# Altium footprint library SAMTEC SMD.PcbLib: 165 footprints (part 8 of 17) (continued)
## SAMTEC_MEC6-130-02-L-D-RA1 [mm] "60 Contacts, Pitch 0.635mm, Double Row Right Angle Edge Card Socket"
height 5.78
pads (62):
  rect 0.4x2 smd mask+0: 1(-9.207,-4) 2(-9.207,4) 3(-8.572,-4) 4(-8.572,4) 5(-7.938,-4) 6(-7.938,4) 7(-7.302,-4) 8(-7.302,4) 9(-6.667,-4) 10(-6.667,4) 11(-6.032,-4) 12(-6.032,4) 13(-5.397,-4) 14(-5.397,4) 15(-4.763,-4) 16(-4.763,4) 17(-4.127,-4) 18(-4.127,4) 19(-3.492,-4) 20(-3.492,4) 21(-2.857,-4) 22(-2.857,4) 23(-2.222,-4) 24(-2.222,4) 25(-1.587,-4) 26(-1.587,4) 27(-0.953,-4) 28(-0.953,4) 29(-0.318,-4) 30(-0.318,4) 31(0.318,-4) 32(0.318,4) 33(0.953,-4) 34(0.953,4) 35(1.587,-4) 36(1.587,4) 37(2.222,-4) 38(2.222,4) 39(2.857,-4) 40(2.857,4) 41(3.492,-4) 42(3.492,4) 43(4.127,-4) 44(4.127,4) 45(4.763,-4) 46(4.763,4) 47(5.397,-4) 48(5.397,4) 49(6.032,-4) 50(6.032,4) 51(6.667,-4) 52(6.667,4) 53(7.302,-4) 54(7.302,4) 55(7.938,-4) 56(7.938,4) 57(8.572,-4) 58(8.572,4) 59(9.207,-4) 60(9.207,4)
  round 0.5 hole 1.55 unplated mask+0.525: 61(-10.428,0) 62(10.401,0)
Top Overlay:
  circle w0.25: c-10.1,-4.65 r0.125
  lines w0.2: -11.11,-1.1 -11.11,-3.7 -9.757,-3.7 ; -11.11,1.1 -11.11,2.5 -9.91,3.7 -9.757,3.7 ; -9.407,-2.65 -9.407,-1.4 -9.008,-1.4 -9.008,-2.65 ; -8.772,-2.65 -8.772,-1.4 -8.373,-1.4 -8.373,-2.65 ; -8.137,-2.65 -8.137,-1.4 -7.738,-1.4 -7.738,-2.65 ; -7.502,-2.65 -7.502,-1.4 -7.103,-1.4 -7.103,-2.65 ; -6.867,-2.65 -6.867,-1.4 -6.468,-1.4 -6.468,-2.65 ; -6.232,-2.65 -6.232,-1.4 -5.833,-1.4 -5.833,-2.65 ; -5.597,-2.65 -5.597,-1.4 -5.198,-1.4 -5.198,-2.65 ; -4.962,-2.65 -4.962,-1.4 -4.563,-1.4 -4.563,-2.65 ; -4.327,-2.65 -4.327,-1.4 -3.928,-1.4 -3.928,-2.65 ; -3.692,-2.65 -3.692,-1.4 -3.293,-1.4 -3.293,-2.65 ; -3.057,-2.65 -3.057,-1.4 -2.658,-1.4 -2.658,-2.65 ; -2.422,-2.65 -2.422,-1.4 -2.023,-1.4 -2.023,-2.65 ; -1.787,-2.65 -1.787,-1.4 -1.388,-1.4 -1.388,-2.65 ; -1.152,-2.65 -1.152,-1.4 -0.753,-1.4 -0.753,-2.65 ; -0.517,-2.65 -0.517,-1.4 -0.118,-1.4 -0.118,-2.65 ; 0.118,-2.65 0.118,-1.4 0.517,-1.4 0.517,-2.65 ; 0.753,-2.65 0.753,-1.4 1.152,-1.4 1.152,-2.65 ; 1.388,-2.65 1.388,-1.4 1.787,-1.4 1.787,-2.65 ; 2.023,-2.65 2.023,-1.4 2.422,-1.4 2.422,-2.65 ; 2.658,-2.65 2.658,-1.4 3.057,-1.4 3.057,-2.65 ; 3.293,-2.65 3.293,-1.4 3.692,-1.4 3.692,-2.65 ; 3.928,-2.65 3.928,-1.4 4.327,-1.4 4.327,-2.65 ; 4.563,-2.65 4.563,-1.4 4.962,-1.4 4.962,-2.65 ; 5.198,-2.65 5.198,-1.4 5.597,-1.4 5.597,-2.65 ; 5.833,-2.65 5.833,-1.4 6.232,-1.4 6.232,-2.65 ; 6.468,-2.65 6.468,-1.4 6.867,-1.4 6.867,-2.65 ; 7.103,-2.65 7.103,-1.4 7.502,-1.4 7.502,-2.65 ; 7.738,-2.65 7.738,-1.4 8.137,-1.4 8.137,-2.65 ; 8.373,-2.65 8.373,-1.4 8.772,-1.4 8.772,-2.65 ; 9.008,-2.65 9.008,-1.4 9.407,-1.4 9.407,-2.65 ; 9.757,-3.7 11.11,-3.7 11.11,-1.1 ; 9.757,3.7 9.91,3.7 11.11,2.5 11.11,1.1
Mechanical 8:
  drawing of 377 lines, arcs and shapes, not listed
Mechanical 14:
  drawing of 306 lines, arcs and shapes, not listed
Mechanical 15:
  lines w0.05: -11.36,-5.25 11.36,-5.25 11.36,5.25 -11.36,5.25 -11.36,-5.25
3D body "SAMTEC_MEC6-130-02-L-D-RA1.stp": height 5.78, standoff -1.05, extent -11.11,-4.55 11.11,4.55

## SAMTEC_MEC6-130-02-L-DV-A [mm] "60 Contacts, Pitch 0.635mm, Double Row Vertical Micro Edge Card Socket"
height 8.65
pads (62):
  rect 0.4x1.8 smd mask+0: 1(-9.207,-3.85) 2(-9.207,3.85) 3(-8.572,-3.85) 4(-8.572,3.85) 5(-7.938,-3.85) 6(-7.938,3.85) 7(-7.302,-3.85) 8(-7.302,3.85) 9(-6.667,-3.85) 10(-6.667,3.85) 11(-6.032,-3.85) 12(-6.032,3.85) 13(-5.397,-3.85) 14(-5.397,3.85) 15(-4.763,-3.85) 16(-4.763,3.85) 17(-4.127,-3.85) 18(-4.127,3.85) 19(-3.492,-3.85) 20(-3.492,3.85) 21(-2.857,-3.85) 22(-2.857,3.85) 23(-2.222,-3.85) 24(-2.222,3.85) 25(-1.587,-3.85) 26(-1.587,3.85) 27(-0.953,-3.85) 28(-0.953,3.85) 29(-0.318,-3.85) 30(-0.318,3.85) 31(0.318,-3.85) 32(0.318,3.85) 33(0.953,-3.85) 34(0.953,3.85) 35(1.587,-3.85) 36(1.587,3.85) 37(2.222,-3.85) 38(2.222,3.85) 39(2.857,-3.85) 40(2.857,3.85) 41(3.492,-3.85) 42(3.492,3.85) 43(4.127,-3.85) 44(4.127,3.85) 45(4.763,-3.85) 46(4.763,3.85) 47(5.397,-3.85) 48(5.397,3.85) 49(6.032,-3.85) 50(6.032,3.85) 51(6.667,-3.85) 52(6.667,3.85) 53(7.302,-3.85) 54(7.302,3.85) 55(7.938,-3.85) 56(7.938,3.85) 57(8.572,-3.85) 58(8.572,3.85) 59(9.207,-3.85) 60(9.207,3.85)
  round 0.5 hole 1.55 unplated mask+0.525: 61(-10.71,-1.5) 62(10.71,0)
Top Overlay:
  drawing of 266 lines, arcs and shapes, not listed
Mechanical 8:
  drawing of 369 lines, arcs and shapes, not listed
Mechanical 14:
  drawing of 443 lines, arcs and shapes, not listed
Mechanical 15:
  lines w0.05: -12.16,-5 -12.16,5 12.16,5 12.16,-5 -12.16,-5
3D body "SAMTEC_MEC6-130-02-L-DV-A.stp": height 8.65, standoff -0.85, extent -11.91,-4.4 11.91,4.4

## SAMTEC_MEC6-140-02-L-D-RA1 [mm] "80 Contacts, Pitch 0.635mm, Right Angle Micro Edge Card Socket"
height 5.78
pads (82):
  rect 0.4x2 smd mask+0: 1(-12.382,-4) 2(-12.382,4) 3(-11.747,-4) 4(-11.747,4) 5(-11.112,-4) 6(-11.112,4) 7(-10.477,-4) 8(-10.477,4) 9(-9.842,-4) 10(-9.842,4) 11(-9.207,-4) 12(-9.207,4) 13(-8.572,-4) 14(-8.572,4) 15(-7.937,-4) 16(-7.937,4) 17(-7.302,-4) 18(-7.302,4) 19(-6.667,-4) 20(-6.667,4) 21(-6.032,-4) 22(-6.032,4) 23(-5.397,-4) 24(-5.397,4) 25(-4.762,-4) 26(-4.762,4) 27(-4.127,-4) 28(-4.127,4) 29(-3.492,-4) 30(-3.492,4) 31(-2.857,-4) 32(-2.857,4) 33(-2.222,-4) 34(-2.222,4) 35(-1.587,-4) 36(-1.587,4) 37(-0.952,-4) 38(-0.952,4) 39(-0.317,-4) 40(-0.317,4) 41(0.318,-4) 42(0.318,4) 43(0.953,-4) 44(0.953,4) 45(1.588,-4) 46(1.588,4) 47(2.223,-4) 48(2.223,4) 49(2.858,-4) 50(2.858,4) 51(3.493,-4) 52(3.493,4) 53(4.128,-4) 54(4.128,4) 55(4.763,-4) 56(4.763,4) 57(5.398,-4) 58(5.398,4) 59(6.033,-4) 60(6.033,4) 61(6.668,-4) 62(6.668,4) 63(7.303,-4) 64(7.303,4) 65(7.938,-4) 66(7.938,4) 67(8.573,-4) 68(8.573,4) 69(9.208,-4) 70(9.208,4) 71(9.843,-4) 72(9.843,4) 73(10.478,-4) 74(10.478,4) 75(11.113,-4) 76(11.113,4) 77(11.748,-4) 78(11.748,4) 79(12.383,-4) 80(12.383,4)
  round 0.5 hole 1.55 unplated mask+0.525: 81(-13.582,0) 82(13.583,0)
Top Overlay:
  lines w0.2: -14.282,-0.816 -14.282,-3.7 -12.982,-3.7 ; -14.282,0.816 -14.282,2.5 -13.082,3.7 -12.982,3.7 ; 12.925,-2.65 13.733,-2.65 ; 12.925,-0.87 12.925,-3.2 14.208,-3.2 13.733,-2.725 13.733,-1.06 ; 12.925,0.87 12.925,3.023 14.283,1.666 ; 12.983,-3.7 14.283,-3.7 14.283,-0.792 ; 12.983,3.7 13.083,3.7 14.283,2.5 14.283,0.792 ; 13.733,1.06 13.733,2.216
Mechanical 8:
  lines w0.1: -14.082,0 -13.582,0 ; -13.582,-0.5 -13.582,0 ; -13.582,0.5 -13.582,0 ; -13.082,0 -13.582,0 ; -0.5,0 0,0 ; 0,-0.5 0,0 ; 0,0.5 0,0 ; 0.5,0 0,0 ; 13.083,0 13.583,0 ; 13.583,-0.5 13.583,0 ; 13.583,0.5 13.583,0 ; 14.083,0 13.583,0 ; -12.582,-5 -12.382,-4 -12.182,-5 ; -12.582,-5 -12.582,-3 -12.182,-3 -12.182,-5 ; -12.582,-5 -12.182,-5 ; -12.582,5 -12.382,4 -12.182,5 ; -12.582,5 -12.582,3 -12.182,3 -12.182,5 ; -12.582,5 -12.182,5 ; -11.947,-5 -11.747,-4 -11.547,-5 ; -11.947,-5 -11.947,-3 -11.547,-3 -11.547,-5 ; -11.947,-5 -11.547,-5 ; -11.947,5 -11.747,4 -11.547,5 ; -11.947,5 -11.947,3 -11.547,3 -11.547,5 ; -11.947,5 -11.547,5 ; 11.548,-5 11.748,-4 11.948,-5 ; 11.548,-5 11.548,-3 11.948,-3 11.948,-5 ; 11.548,-5 11.948,-5 ; 11.548,5 11.748,4 11.948,5 ; 11.548,5 11.548,3 11.948,3 11.948,5 ; 11.548,5 11.948,5 ; 12.183,-5 12.383,-4 12.583,-5 ; 12.183,-5 12.183,-3 12.583,-3 12.583,-5 ; 12.183,-5 12.583,-5 ; 12.183,5 12.383,4 12.583,5 ; 12.183,5 12.183,3 12.583,3 12.583,5 ; 12.183,5 12.583,5
Mechanical 14:
  lines w0.1: -14.282,-3.7 14.283,-3.7 14.283,2.5 13.083,3.7 -13.082,3.7 -14.282,2.5 -14.282,-3.7
Mechanical 15:
  lines w0.05: -14.532,-5.25 14.533,-5.25 14.533,5.25 -14.532,5.25 -14.532,-5.25
3D body "SAMTEC_MEC6-140-02-L-D-RA1.stp": height 5.77, standoff -1.05, extent -14.282,-4.55 14.283,4.55

## SAMTEC_MEC6-150-02-L-D-RA1 [mm] "100 Contacts, Pitch 0.635mm, Right Angle Micro Edge Card Socket"
height 5.78
pads (102):
  rect 0.4x2 smd mask+0: 1(-17.145,-4) 2(-17.145,4) 3(-16.51,-4) 4(-16.51,4) 5(-15.875,-4) 6(-15.875,4) 7(-15.24,-4) 8(-15.24,4) 9(-14.605,-4) 10(-14.605,4) 11(-13.97,-4) 12(-13.97,4) 13(-13.335,-4) 14(-13.335,4) 15(-12.7,-4) 16(-12.7,4) 17(-12.065,-4) 18(-12.065,4) 19(-11.43,-4) 20(-11.43,4) 21(-10.795,-4) 22(-10.795,4) 23(-10.16,-4) 24(-10.16,4) 25(-9.525,-4) 26(-9.525,4) 27(-8.89,-4) 28(-8.89,4) 29(-8.255,-4) 30(-8.255,4) 31(-7.62,-4) 32(-7.62,4) 33(-6.985,-4) 34(-6.985,4) 35(-6.35,-4) 36(-6.35,4) 37(-5.715,-4) 38(-5.715,4) 39(-5.08,-4) 40(-5.08,4) 41(-4.445,-4) 42(-4.445,4) 43(-3.81,-4) 44(-3.81,4) 45(-3.175,-4) 46(-3.175,4) 47(-2.54,-4) 48(-2.54,4) 49(-1.905,-4) 50(-1.905,4) 51(-1.27,-4) 52(-1.27,4) 53(-0.635,-4) 54(-0.635,4) 55(0,-4) 56(0,4) 57(0.635,-4) 58(0.635,4) 59(1.27,-4) 60(1.27,4) 61(1.905,-4) 62(1.905,4) 63(5.715,-4) 64(5.715,4) 65(6.35,-4) 66(6.35,4) 67(6.985,-4) 68(6.985,4) 69(7.62,-4) 70(7.62,4) 71(8.255,-4) 72(8.255,4) 73(8.89,-4) 74(8.89,4) 75(9.525,-4) 76(9.525,4) 77(10.16,-4) 78(10.16,4) 79(10.795,-4) 80(10.795,4) 81(11.43,-4) 82(11.43,4) 83(12.065,-4) 84(12.065,4) 85(12.7,-4) 86(12.7,4) 87(13.335,-4) 88(13.335,4) 89(13.97,-4) 90(13.97,4) 91(14.605,-4) 92(14.605,4) 93(15.24,-4) 94(15.24,4) 95(15.875,-4) 96(15.875,4) 97(16.51,-4) 98(16.51,4) 99(17.145,-4) 100(17.145,4)
  round 0.5 hole 1.55 unplated mask+0.525: 101(-18.345,0) 102(18.345,0)
Top Overlay:
  lines w0.2: -19.045,-0.816 -19.045,-3.7 -17.745,-3.7 ; -19.045,0.816 -19.045,2.5 -17.845,3.7 -17.745,3.7 ; 2.505,-3.7 5.115,-3.7 ; 2.505,3.7 5.115,3.7 ; 17.688,-2.65 18.495,-2.65 ; 17.688,-0.87 17.688,-3.2 18.97,-3.2 18.495,-2.725 18.495,-1.06 ; 17.688,0.87 17.688,3.023 19.045,1.666 ; 17.745,-3.7 19.045,-3.7 19.045,-0.792 ; 17.745,3.7 17.845,3.7 19.045,2.5 19.045,0.792 ; 18.495,1.06 18.495,2.216
Mechanical 8:
  lines w0.1: -18.845,0 -18.345,0 ; -18.345,-0.5 -18.345,0 ; -18.345,0.5 -18.345,0 ; -17.845,0 -18.345,0 ; -0.5,0 0,0 ; 0,-0.5 0,0 ; 0,0.5 0,0 ; 0.5,0 0,0 ; 17.845,0 18.345,0 ; 18.345,-0.5 18.345,0 ; 18.345,0.5 18.345,0 ; 18.845,0 18.345,0 ; -17.345,-5 -16.945,-5 ; -17.345,-5 -17.345,-3 -16.945,-3 -16.945,-5 ; -17.345,-5 -17.145,-4 -16.945,-5 ; -17.345,5 -16.945,5 ; -17.345,5 -17.345,3 -16.945,3 -16.945,5 ; -17.345,5 -17.145,4 -16.945,5 ; -16.71,-5 -16.31,-5 ; -16.71,-5 -16.71,-3 -16.31,-3 -16.31,-5 ; -16.71,-5 -16.51,-4 -16.31,-5 ; -16.71,5 -16.31,5 ; -16.71,5 -16.71,3 -16.31,3 -16.31,5 ; -16.71,5 -16.51,4 -16.31,5 ; 1.07,-5 1.47,-5 ; 1.07,-5 1.07,-3 1.47,-3 1.47,-5 ; 1.07,-5 1.27,-4 1.47,-5 ; 1.07,5 1.47,5 ; 1.07,5 1.07,3 1.47,3 1.47,5 ; 1.07,5 1.27,4 1.47,5 ; 1.705,-5 2.105,-5 ; 1.705,-5 1.705,-3 2.105,-3 2.105,-5 ; 1.705,-5 1.905,-4 2.105,-5 ; 1.705,5 2.105,5 ; 1.705,5 1.705,3 2.105,3 2.105,5 ; 1.705,5 1.905,4 2.105,5 ; 5.515,-5 5.915,-5 ; 5.515,-5 5.515,-3 5.915,-3 5.915,-5 ; 5.515,-5 5.715,-4 5.915,-5 ; 5.515,5 5.915,5 ; 5.515,5 5.515,3 5.915,3 5.915,5 ; 5.515,5 5.715,4 5.915,5 ; 6.15,-5 6.55,-5 ; 6.15,-5 6.15,-3 6.55,-3 6.55,-5 ; 6.15,-5 6.35,-4 6.55,-5 ; 6.15,5 6.55,5 ; 6.15,5 6.15,3 6.55,3 6.55,5 ; 6.15,5 6.35,4 6.55,5 ; 16.31,-5 16.71,-5 ; 16.31,-5 16.31,-3 16.71,-3 16.71,-5 ; 16.31,-5 16.51,-4 16.71,-5 ; 16.31,5 16.71,5 ; 16.31,5 16.31,3 16.71,3 16.71,5 ; 16.31,5 16.51,4 16.71,5 ; 16.945,-5 17.345,-5 ; 16.945,-5 16.945,-3 17.345,-3 17.345,-5 ; 16.945,-5 17.145,-4 17.345,-5 ; 16.945,5 17.345,5 ; 16.945,5 16.945,3 17.345,3 17.345,5 ; 16.945,5 17.145,4 17.345,5
Mechanical 14:
  lines w0.1: -19.045,-0.77 -18.915,-0.77 -18.915,0.77 -19.045,0.77 ; 17.688,-2.65 18.495,-2.65 ; 18.495,2.216 18.495,-2.725 18.97,-3.2 17.688,-3.2 17.688,3.023 19.045,1.666 ; -19.045,-3.7 -19.045,2.5 -17.845,3.7 17.845,3.7 19.045,2.5 19.045,-3.7 -19.045,-3.7
Mechanical 15:
  lines w0.05: -19.295,-5.25 -19.295,5.25 19.295,5.25 19.295,-5.25 -19.295,-5.25
3D body "SAMTEC_MEC6-150-02-L-D-RA1.stp": height 5.77, standoff -1.05, extent -19.045,-4.55 19.045,4.55

## SAMTEC_MHDMR-19-02-H-TH-L-TR [mm] "19 Contacts, Pitch 0.4mm, Right Angle, Mini  HDMI High Speed I/O Receptacle"
height 3.2
pads (23):
  rect 0.24x2.05 smd: 1(3.6,0) 2(3.2,0) 3(2.8,0) 4(2.4,0) 5(2,0) 6(1.6,0) 7(1.2,0) 8(0.8,0) 9(0.4,0) 10(0,0) 11(-0.4,0) 12(-0.8,0) 13(-1.2,0) 14(-1.6,0) 15(-2,0) 16(-2.4,0) 17(-2.8,0) 18(-3.2,0) 19(-3.6,0)
  oval 1.32x1.96 hole 0.62 slot 1.26 at 90 deg: SHIELD(-5.425,-5.281) SHIELD(5.423,-5.281)
  oval 1.22x2.14 hole 0.62 slot 1.44 at 90 deg: SHIELD(-5.425,-0.83) SHIELD(5.423,-0.83)
Top Overlay:
  circle w0.25: c4.425,0.5 r0.125
  lines w0.2: -5.6,-6.5 -5.6,-7.33 5.599,-7.33 5.599,-6.5 ; -5.6,-4 -5.6,-2.2 ; -4.6,0.036 -4.199,0.036 ; -3.904,-5.999 ccw(c-3.905,-5.904) -3.82,-5.947 -3.82,-5.937 -3.594,-3.459 cw(c-3.485,-3.474) -3.58,-3.42 cw(c-3.417,-3.562) -3.416,-3.345 -2.814,-3.345 cw(c-2.813,-3.562) -2.65,-3.42 cw(c-2.745,-3.474) -2.636,-3.459 ; -2.636,-3.46 -2.481,-5.473 -2.481,-5.905 ccw(c-2.387,-5.905) -2.4,-5.998 ; 2.322,-5.999 ccw(c2.322,-5.904) 2.407,-5.947 2.407,-5.937 2.633,-3.459 cw(c2.742,-3.474) 2.646,-3.42 cw(c2.81,-3.562) 2.811,-3.345 3.412,-3.345 cw(c3.413,-3.562) 3.577,-3.42 cw(c3.482,-3.474) 3.59,-3.459 ; 3.59,-3.46 3.746,-5.473 3.746,-5.905 ccw(c3.84,-5.905) 3.827,-5.998 ; 4.201,0.036 4.6,0.036 ; 5.599,-4 5.599,-2.2 ; -4.006,-5.897 ccw(c-3.912,-5.905) -3.912,-5.999 -2.316,-5.999 ccw(c-2.316,-5.905) -2.222,-5.897 -2.468,-3.093 ccw(c-2.57,-3.102) -2.57,-2.999 -3.658,-2.999 ccw(c-3.658,-3.102) -3.761,-3.093 -4.006,-5.897 ; 2.221,-5.897 ccw(c2.314,-5.905) 2.314,-5.999 3.911,-5.999 ccw(c3.911,-5.905) 4.004,-5.897 3.759,-3.093 ccw(c3.657,-3.102) 3.657,-2.999 2.568,-2.999 ccw(c2.568,-3.102) 2.466,-3.093 2.221,-5.897
Mechanical 8:
  lines w0.1: -5.925,-5.68 -5.425,-5.68 -4.925,-5.68 ; -5.925,-5.281 -5.425,-5.281 -4.925,-5.281 ; -5.925,-4.88 -5.425,-4.88 -4.925,-4.88 ; -5.925,-1.28 -5.425,-1.28 -4.925,-1.28 ; -5.925,-0.83 -5.425,-0.83 -4.925,-0.83 ; -5.925,-0.38 -5.425,-0.38 -4.925,-0.38 ; -5.425,-6.18 -5.425,-4.38 ; -5.425,-1.78 -5.425,0.12 ; -4.1,0 -3.6,0 ; -3.6,-0.5 -3.6,0 ; -3.6,0.5 -3.6,0 ; -3.2,-0.5 -3.2,0 ; -3.2,0.5 -3.2,0 ; -2.8,-0.5 -2.8,0 ; -2.8,0.5 -2.8,0 ; -2.4,-0.5 -2.4,0 ; -2.4,0.5 -2.4,0 ; -2,-0.5 -2,0 ; -2,0.5 -2,0 ; -1.6,-0.5 -1.6,0 ; -1.6,0.5 -1.6,0 ; -1.2,-0.5 -1.2,0 ; -1.2,0.5 -1.2,0 ; -0.8,-0.5 -0.8,0 ; -0.8,0.5 -0.8,0 ; -0.4,-0.5 -0.4,0 ; -0.4,0.5 -0.4,0 ; 0,-0.5 0,0 ; 0,0.5 0,0 ; 0.4,-0.5 0.4,0 ; 0.4,0.5 0.4,0 ; 0.8,-0.5 0.8,0 ; 0.8,0.5 0.8,0 ; 1.2,-0.5 1.2,0 ; 1.2,0.5 1.2,0 ; 1.6,-0.5 1.6,0 ; 1.6,0.5 1.6,0 ; 2,-0.5 2,0 ; 2,0.5 2,0 ; 2.4,-0.5 2.4,0 ; 2.4,0.5 2.4,0 ; 2.8,-0.5 2.8,0 ; 2.8,0.5 2.8,0 ; 3.2,-0.5 3.2,0 ; 3.2,0.5 3.2,0 ; 3.6,-0.5 3.6,0 ; 3.6,0.5 3.6,0 ; 4.1,0 3.6,0 ; 4.923,-5.281 5.423,-5.281 5.923,-5.281 ; 4.923,-0.83 5.423,-0.83 5.923,-0.83 ; 4.925,-5.68 5.425,-5.68 5.925,-5.68 ; 4.925,-4.88 5.425,-4.88 5.925,-4.88 ; 4.925,-1.28 5.425,-1.28 5.925,-1.28 ; 4.925,-0.38 5.425,-0.38 5.925,-0.38 ; 5.425,-6.18 5.425,-4.38 ; 5.425,-1.78 5.425,0.12 ; -3.6,0 -3.2,0 ; -3.2,0 -2.8,0 ; -2.8,0 -2.4,0 ; -2.4,0 -2,0 ; -2,0 -1.6,0 ; -1.6,0 -1.2,0 ; -1.2,0 -0.8,0 ; -0.8,0 -0.4,0 ; -0.4,0 0,0 ; 0,0 0.4,0 ; 0.4,0 0.8,0 ; 0.8,0 1.2,0 ; 1.2,0 1.6,0 ; 1.6,0 2,0 ; 2,0 2.4,0 ; 2.4,0 2.8,0 ; 2.8,0 3.2,0 ; 3.2,0 3.6,0
Mechanical 14:
  circle w0.1: c4.425,0.5 r0.2
  lines w0.1: -5.345,-0.33 -5.345,0.036 5.343,0.036 5.343,-0.33 ; -3.904,-5.999 ccw(c-3.905,-5.904) -3.82,-5.947 -3.82,-5.937 -3.594,-3.459 cw(c-3.485,-3.474) -3.58,-3.42 cw(c-3.417,-3.562) -3.416,-3.345 -2.814,-3.345 cw(c-2.813,-3.562) -2.65,-3.42 cw(c-2.745,-3.474) -2.636,-3.459 ; -3.699,0.036 -3.699,0.871 -3.499,0.871 -3.499,0.036 ; -3.449,-0.33 -3.449,-1.031 ccw(c-3.149,-1.031) -2.849,-1.031 -2.849,-0.33 ; -3.299,0.036 -3.299,0.871 -3.099,0.871 -3.099,0.036 ; -2.899,0.036 -2.899,0.871 -2.699,0.871 -2.699,0.036 ; -2.636,-3.46 -2.481,-5.473 -2.481,-5.905 ccw(c-2.387,-5.905) -2.4,-5.998 ; -2.499,0.036 -2.499,0.871 -2.299,0.871 -2.299,0.036 ; -2.099,0.036 -2.099,0.871 -1.899,0.871 -1.899,0.036 ; -1.699,0.036 -1.699,0.871 -1.499,0.871 -1.499,0.036 ; -1.299,0.036 -1.299,0.871 -1.099,0.871 -1.099,0.036 ; -0.899,0.036 -0.899,0.871 -0.699,0.871 -0.699,0.036 ; -0.501,-0.783 0.499,-0.783 ; -0.501,-0.651 0.499,-0.651 ; -0.499,-0.614 -0.499,-1.531 0.499,-1.531 0.501,-0.614 ; -0.499,0.036 -0.499,0.871 -0.299,0.871 -0.299,0.036 ; -0.099,0.036 -0.099,0.871 0.101,0.871 0.101,0.036 ; 0.301,0.036 0.301,0.871 0.501,0.871 0.501,0.036 ; 0.701,0.036 0.701,0.871 0.901,0.871 0.901,0.036 ; 1.101,0.036 1.101,0.871 1.301,0.871 1.301,0.036 ; 1.501,0.036 1.501,0.871 1.701,0.871 1.701,0.036 ; 1.901,0.036 1.901,0.871 2.101,0.871 2.101,0.036 ; 2.301,0.036 2.301,0.871 2.501,0.871 2.501,0.036 ; 2.322,-5.999 ccw(c2.322,-5.904) 2.407,-5.947 2.407,-5.937 2.633,-3.459 cw(c2.742,-3.474) 2.646,-3.42 cw(c2.81,-3.562) 2.811,-3.345 3.412,-3.345 cw(c3.413,-3.562) 3.577,-3.42 cw(c3.482,-3.474) 3.59,-3.459 ; 2.701,0.036 2.701,0.871 2.901,0.871 2.901,0.036 ; 2.848,-0.33 2.848,-1.031 ccw(c3.148,-1.031) 3.447,-1.031 3.447,-0.33 ; 3.101,0.036 3.101,0.871 3.301,0.871 3.301,0.036 ; 3.501,0.036 3.501,0.871 3.701,0.871 3.701,0.036 ; 3.59,-3.46 3.746,-5.473 3.746,-5.905 ccw(c3.84,-5.905) 3.827,-5.998 ; -5.6,-7.33 -5.6,-0.33 5.599,-0.33 5.599,-7.33 -5.6,-7.33 ; -5.576,-5.755 -5.576,-4.104 -4.598,-4.104 -4.598,-5.755 -5.576,-5.755 ; -4.006,-5.897 ccw(c-3.912,-5.905) -3.912,-5.999 -2.316,-5.999 ccw(c-2.316,-5.905) -2.222,-5.897 -2.468,-3.093 ccw(c-2.57,-3.102) -2.57,-2.999 -3.658,-2.999 ccw(c-3.658,-3.102) -3.761,-3.093 -4.006,-5.897 ; 2.221,-5.897 ccw(c2.314,-5.905) 2.314,-5.999 3.911,-5.999 ccw(c3.911,-5.905) 4.004,-5.897 3.759,-3.093 ccw(c3.657,-3.102) 3.657,-2.999 2.568,-2.999 ccw(c2.568,-3.102) 2.466,-3.093 2.221,-5.897 ; 4.597,-5.755 4.597,-4.104 5.575,-4.104 5.575,-5.755 4.597,-5.755
3D body "SAMTEC_MHDMR-19-02-H-TH-L-TR.stp": height 3.28, standoff -0.92, extent -5.74,-7.33 5.738,0.871

## SAMTEC_MLE-105-01-G-DV-A [mm] "10 Contacts - Pitch 1mm - Top Entry, Dual Row Surface Mount Receptacle"
height 3.5
pads (12):
  rect 0.61x1.709 smd: 1(-2,1.686) 2(-2,-1.686) 3(-1,1.686) 4(-1,-1.686) 5(0,1.686) 6(0,-1.686) 7(1,1.686) 8(1,-1.686) 9(2,1.686) 10(2,-1.686)
  round 0.5 hole 0.7 unplated mask+0.1: 11(-1.5,0) 11(1.5,0)
Top Overlay:
  circle w0.25: c-2.987,2.606 r0.125
  circle w0.25: c-2.987,2.606 r0.125
  lines w0.2: -2.6,-0.431 -2.6,0.431 ; 2.6,-0.431 2.6,0.431
Mechanical 8:
  circle w0.1: c-1.5,0 r0.35
  circle w0.1: c1.5,0 r0.35
  lines w0.1: -2,-1.186 -2,-1.686 -1.5,-1.686 ; -2,0 -1.5,0 ; -2,2.186 -2,1.686 -1.5,1.686 ; -1.5,-0.5 -1.5,0 ; -1.5,0.5 -1.5,0 ; -1,-1.186 -1,-1.686 -0.5,-1.686 ; -1,0 -1.5,0 ; -1,2.186 -1,1.686 -0.5,1.686 ; -0.5,0 0,0 ; 0,-1.186 0,-1.686 0.5,-1.686 ; 0,-0.5 0,0 ; 0,0.5 0,0 ; 0,2.186 0,1.686 0.5,1.686 ; 0.5,0 0,0 ; 1,-1.186 1,-1.686 1.5,-1.686 ; 1,0 1.5,0 ; 1,2.186 1,1.686 1.5,1.686 ; 1.5,-0.5 1.5,0 ; 1.5,0.5 1.5,0 ; 2,-1.186 2,-1.686 2.5,-1.686 ; 2,0 1.5,0 ; 2,2.186 2,1.686 2.5,1.686 ; -2.305,-2.54 -2.305,-0.831 -1.695,-0.831 -1.695,-2.54 -2.305,-2.54 ; -2.305,0.831 -2.305,2.54 -1.695,2.54 -1.695,0.831 -2.305,0.831 ; -1.305,-2.54 -1.305,-0.831 -0.695,-0.831 -0.695,-2.54 -1.305,-2.54 ; -1.305,0.831 -1.305,2.54 -0.695,2.54 -0.695,0.831 -1.305,0.831 ; -0.305,-2.54 -0.305,-0.831 0.305,-0.831 0.305,-2.54 -0.305,-2.54 ; -0.305,0.831 -0.305,2.54 0.305,2.54 0.305,0.831 -0.305,0.831 ; 0.695,-2.54 0.695,-0.831 1.305,-0.831 1.305,-2.54 0.695,-2.54 ; 0.695,0.831 0.695,2.54 1.305,2.54 1.305,0.831 0.695,0.831 ; 1.695,-2.54 1.695,-0.831 2.305,-0.831 2.305,-2.54 1.695,-2.54 ; 1.695,0.831 1.695,2.54 2.305,2.54 2.305,0.831 1.695,0.831
Mechanical 14:
  drawing of 155 lines, arcs and shapes, not listed
Mechanical 15:
  lines w0.05: -2.85,-2.79 -2.85,2.79 2.85,2.79 2.85,-2.79 -2.85,-2.79
3D body "SAMTEC_MLE-105-01-X-DV-A.stp": height 3.3, standoff -0.71, extent -2.6,-2.159 2.6,2.159

## SAMTEC_MLE-107-01-G-DV-A [mm] "14 Contacts - Pitch 1mm - Top Entry, Dual Row Surface Mount Receptacle"
height 3.5
pads (16):
  rect 0.61x1.709 smd: 1(-3,1.686) 2(-3,-1.686) 3(-2,1.686) 4(-2,-1.686) 5(-1,1.686) 6(-1,-1.686) 7(0,1.686) 8(0,-1.686) 9(1,1.686) 10(1,-1.686) 11(2,1.686) 12(2,-1.686) 13(3,1.686) 14(3,-1.686)
  round 0.5 hole 0.7 unplated mask+0.1: 15(-2.5,0) 15(2.5,0)
Top Overlay:
  circle w0.25: c-3.987,2.606 r0.125
  circle w0.25: c-3.987,2.606 r0.125
  lines w0.2: -3.6,-0.431 -3.6,0.431 ; 3.6,-0.431 3.6,0.431
Mechanical 8:
  circle w0.1: c-2.5,0 r0.35
  circle w0.1: c2.5,0 r0.35
  lines w0.1: -3,-1.186 -3,-1.686 -2.5,-1.686 ; -3,0 -2.5,0 ; -3,2.186 -3,1.686 -2.5,1.686 ; -2.5,-0.5 -2.5,0 ; -2.5,0.5 -2.5,0 ; -2,-1.186 -2,-1.686 -1.5,-1.686 ; -2,0 -2.5,0 ; -2,2.186 -2,1.686 -1.5,1.686 ; -1,-1.186 -1,-1.686 -0.5,-1.686 ; -1,2.186 -1,1.686 -0.5,1.686 ; -0.5,0 0,0 ; 0,-1.186 0,-1.686 0.5,-1.686 ; 0,-0.5 0,0 ; 0,0.5 0,0 ; 0,2.186 0,1.686 0.5,1.686 ; 0.5,0 0,0 ; 1,-1.186 1,-1.686 1.5,-1.686 ; 1,2.186 1,1.686 1.5,1.686 ; 2,-1.186 2,-1.686 2.5,-1.686 ; 2,0 2.5,0 ; 2,2.186 2,1.686 2.5,1.686 ; 2.5,-0.5 2.5,0 ; 2.5,0.5 2.5,0 ; 3,-1.186 3,-1.686 3.5,-1.686 ; 3,0 2.5,0 ; 3,2.186 3,1.686 3.5,1.686 ; -3.305,-2.54 -3.305,-0.831 -2.695,-0.831 -2.695,-2.54 -3.305,-2.54 ; -3.305,0.831 -3.305,2.54 -2.695,2.54 -2.695,0.831 -3.305,0.831 ; -2.305,-2.54 -2.305,-0.831 -1.695,-0.831 -1.695,-2.54 -2.305,-2.54 ; -2.305,0.831 -2.305,2.54 -1.695,2.54 -1.695,0.831 -2.305,0.831 ; -1.305,-2.54 -1.305,-0.831 -0.695,-0.831 -0.695,-2.54 -1.305,-2.54 ; -1.305,0.831 -1.305,2.54 -0.695,2.54 -0.695,0.831 -1.305,0.831 ; -0.305,-2.54 -0.305,-0.831 0.305,-0.831 0.305,-2.54 -0.305,-2.54 ; -0.305,0.831 -0.305,2.54 0.305,2.54 0.305,0.831 -0.305,0.831 ; 0.695,-2.54 0.695,-0.831 1.305,-0.831 1.305,-2.54 0.695,-2.54 ; 0.695,0.831 0.695,2.54 1.305,2.54 1.305,0.831 0.695,0.831 ; 1.695,-2.54 1.695,-0.831 2.305,-0.831 2.305,-2.54 1.695,-2.54 ; 1.695,0.831 1.695,2.54 2.305,2.54 2.305,0.831 1.695,0.831 ; 2.695,-2.54 2.695,-0.831 3.305,-0.831 3.305,-2.54 2.695,-2.54 ; 2.695,0.831 2.695,2.54 3.305,2.54 3.305,0.831 2.695,0.831
Mechanical 14:
  drawing of 215 lines, arcs and shapes, not listed
Mechanical 15:
  lines w0.05: -3.85,-2.79 -3.85,2.79 3.85,2.79 3.85,-2.79 -3.85,-2.79
3D body "SAMTEC_MLE-107-01-G-DV-A.stp": height 3.3, standoff -0.71, extent -3.6,-2.159 3.6,2.159

## SAMTEC_MMS-112-02-L-DV-K [mm] "24 Contacts - Pitch 2mm - Top Entry, Dual Row Surface Mount Straigh Socket"
height 4.45
pads (48):
  rect 1.02x2.16 smd: 1(11,-2.655) 2(11,2.655) 3(9,-2.655) 4(9,2.655) 5(7,-2.655) 6(7,2.655) 7(5,-2.655) 8(5,2.655) 9(3,-2.655) 10(3,2.655) 11(1,-2.655) 12(1,2.655) 13(-1,-2.655) 14(-1,2.655) 15(-3,-2.655) 16(-3,2.655) 17(-5,-2.655) 18(-5,2.655) 19(-7,-2.655) 20(-7,2.655) 21(-9,-2.655) 22(-9,2.655) 23(-11,-2.655) 24(-11,2.655)
  round 0.5 hole 0.85 unplated mask+0.175: 1b(-1,-1) 1b(-1,1) PT(-11,-1) PT(-11,1) PT(-9,-1) PT(-9,1) PT(-7,-1) PT(-7,1) PT(-5,-1) PT(-5,1) PT(-3,-1) PT(-3,1) PT(1,-1) PT(1,1) PT(3,-1) PT(3,1) PT(5,-1) PT(5,1) PT(7,-1) PT(7,1) PT(9,-1) PT(9,1) PT(11,-1) PT(11,1)
Top Overlay:
  circle w0.25: c11.002,-4.327 r0.125
  lines w0.2: -11.86,-1.999 -12.272,-1.999 -12.275,1.999 -11.86,1.999 ; 11.86,-1.999 12.272,-1.999 12.272,1.999 11.86,1.999
  text "24" at -12,2.58 h1
Mechanical 8:
  drawing of 276 lines, arcs and shapes, not listed
Mechanical 14:
  drawing of 366 lines, arcs and shapes, not listed
  text "24" at -12,2.58 h1
Mechanical 15:
  lines w0.1: -12.523,-3.985 -12.523,3.985 12.522,3.985 12.522,-3.985 -12.523,-3.985
3D body "SAMTEC_MMS-112-02-L-DV-K.stp": height 4.5, standoff 0, extent -12.274,-3.218 12.272,3.218